# Altium footprint library DBLib.PcbLib: 97 footprints (part 2 of 7)
Each footprint in its own frame and in the unit in brackets; x right, y up, seen from the top. Pads: shape width x height; smd on the part's side, far side on the other; paste and mask are expansions set on the pad; w line width, h text height; cw(c..) or ccw(c..) is an arc to the next point about the centre after c.
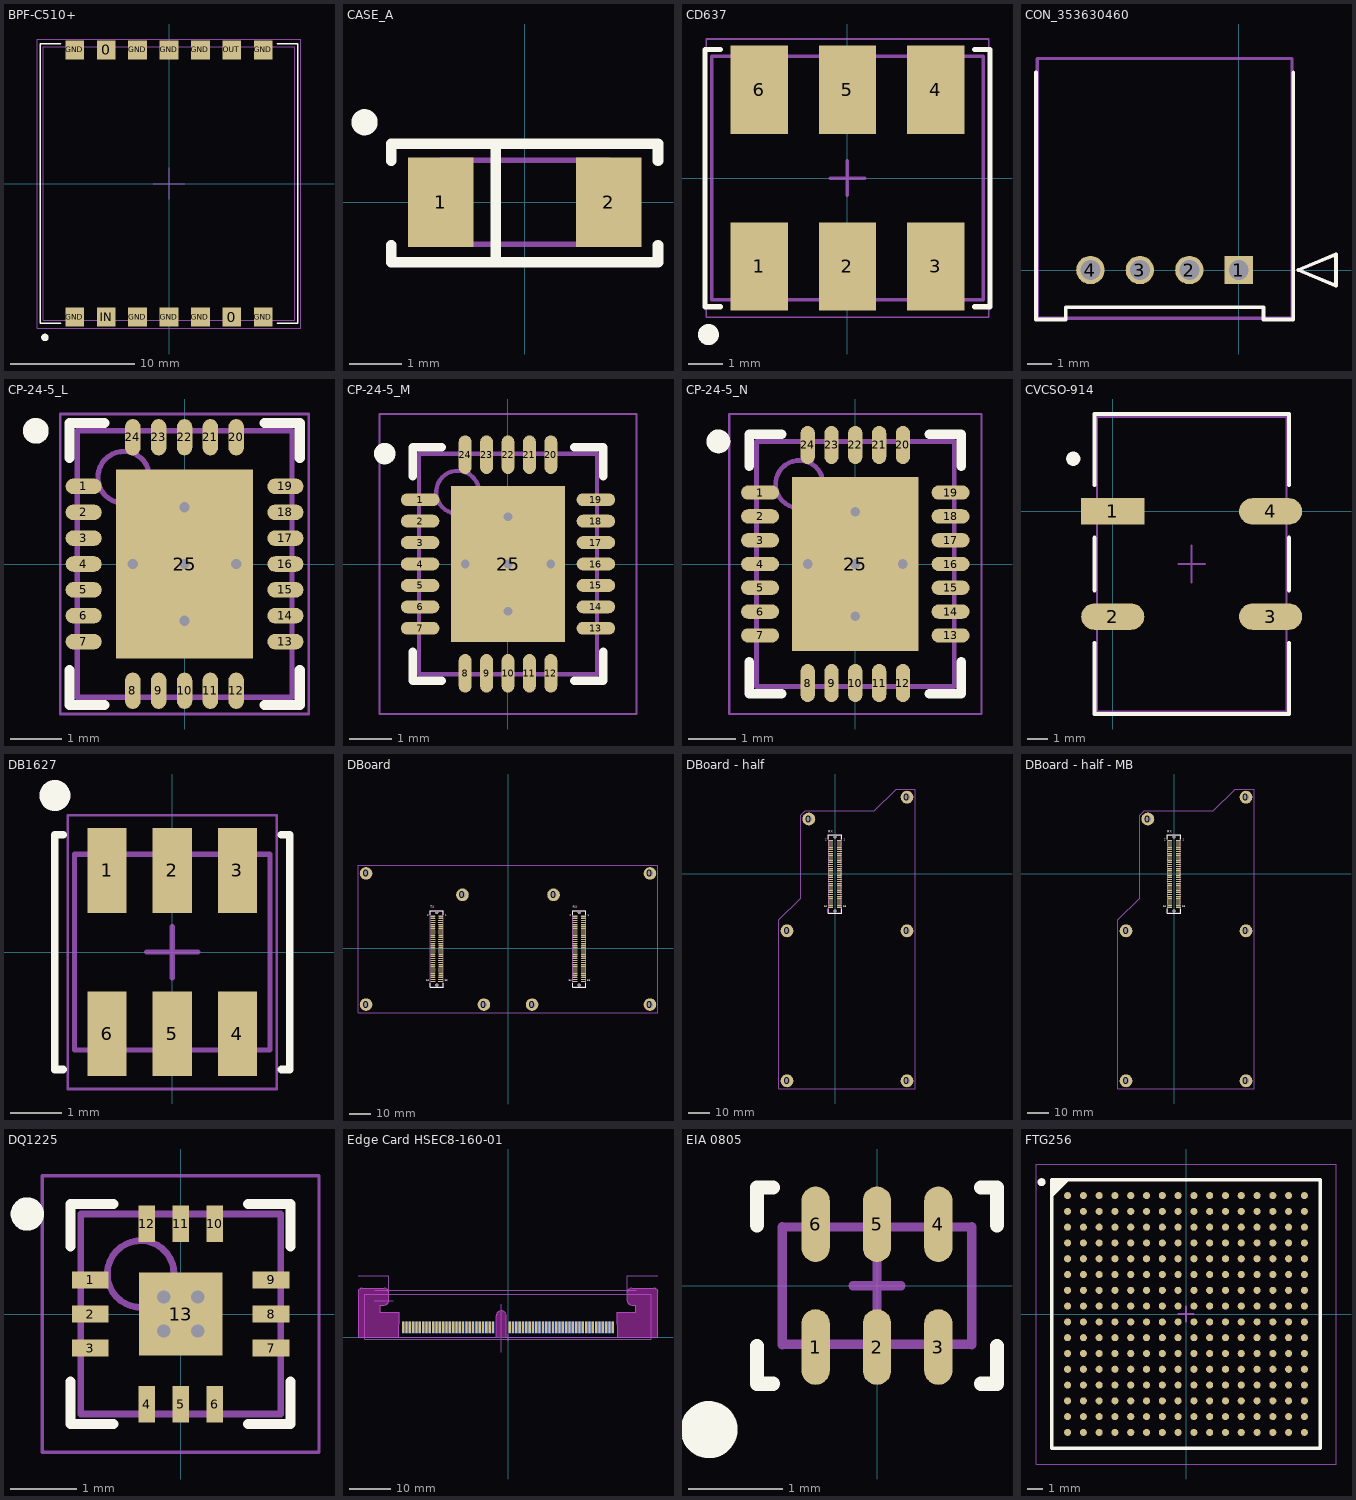
[diagram p1: the footprints below, top view; thin cyan lines are the x and y axes]

## BPF-C510+ [mm] "Bandpass Filter"
height 6.35
pads (14):
  rect 1.52x1.52 smd: 0(-5.08,10.795) 0(5.08,-10.795) GND(-7.62,-10.795) GND(-7.62,10.795) GND(-2.54,-10.795) GND(-2.54,10.795) GND(0,-10.795) GND(0,10.795) GND(2.54,-10.795) GND(2.54,10.795) GND(7.62,-10.795) GND(7.62,10.795) IN(-5.08,-10.795) OUT(5.08,10.795)
Top Overlay:
  circle w0.35: c-10.033,-12.446 r0.127
  lines w0.15: -8.763,-11.303 -10.414,-11.303 -10.414,11.303 -8.763,11.303 ; 8.763,-11.303 10.414,-11.303 10.414,11.303 8.763,11.303
Mechanical 1:
  lines w0.05: -10.668,-11.684 -10.668,11.684 10.668,11.684 10.668,-11.684 -10.668,-11.684
  lines w0.1: -1.27,0 1.27,0 ; 0,-1.27 0,1.27 ; -10.16,-11.049 -10.16,11.049 10.16,11.049 10.16,-11.049 -10.16,-11.049
3D body "User Library-HU1186 pass.step": height 6.35, standoff 0, extent -10.16,-11.07 10.16,11.07

## CASE_A [mm] "Tantalum Cap"
height 0.5
pads (2):
  rect 1.25x1.7 smd: 1(-1.6,0) 2(1.6,0)
Top Overlay:
  circle w0.25: c-3.048,1.524 r0.125
  lines w0.2: -2.54,-0.815 -2.54,-1.143 2.54,-1.143 2.54,-0.815 ; -2.54,0.787 -2.54,1.115 2.54,1.115 2.54,0.787 ; -0.546,-1.143 -0.546,1.115
Mechanical 1:
  lines w0.1: -1.6,-0.8 1.6,-0.8 1.6,0.8 -1.6,0.8 -1.6,-0.8
3D body "User Library-Tantalum Capacitor Case A.STEP": height 1.65, standoff 0, extent -1.698,-0.802 1.693,0.798

## CD637 [mm] "RF Transformer"
height 5.23
pads (6):
  rect 1.65x2.54 smd: 1(-2.54,-2.54) 2(0,-2.54) 3(2.54,-2.54) 4(2.54,2.54) 5(0,2.54) 6(-2.54,2.54)
Top Overlay:
  circle w0.35: c-4,-4.5 r0.127
  lines w0.15: -3.65,-3.7 -4.1,-3.7 -4.1,3.7 -3.65,3.7 ; 3.65,-3.7 4.1,-3.7 4.1,3.7 3.65,3.7
Mechanical 1:
  lines w0.05: -4.064,-4 -4.064,4 4.064,4 4.064,-4 -4.064,-4
  lines w0.1: -0.5,0 0.5,0 ; 0,-0.5 0,0.5 ; -3.9,-3.5 -3.9,3.5 3.9,3.5 3.9,-3.5 -3.9,-3.5
3D body "User Library-CD637.step": height 5.24, standoff 0, extent -3.935,-3.455 3.935,3.455

## CON_353630460 [mm]
pads (4):
  rect 1.15x1.15 hole 0.8 mask+0.076: 1(0,0)
  round 1.15 hole 0.8 mask+0.076: 2(-2,0) 3(-4,0) 4(-6,0)
Top Overlay:
  lines w0.15: -8.2,8 -8.2,-2 -7,-2 -7,-1.5 1,-1.5 1,-2 2.2,-2 2.2,8 ; 2.404,0 3.928,-0.635 3.928,0.635 2.404,0
Mechanical 1:
  lines w0.127: -8.15,-1.95 -8.15,8.55 2.15,8.55 2.15,-1.95 -8.15,-1.95 ; 2.404,0 3.928,-0.635 3.928,0.635 2.404,0
3D body "353630460.stp": height 5.55, standoff -3.15, extent -8.15,-1.95 2.15,8.55
3D body: height 0.25, standoff 0, extent 0,0 0.254,0.254

## CP-24-5_L [mm] "QFN, 24-Leads, Body 4x5mm, Pitch 0.5mm, Thermal Pad 2.65x3.65mm, IPC High Density"
height 1
pads (25):
  oval 0.7x0.3 smd: 1(-1.95,1.5) 2(-1.95,1) 3(-1.95,0.5) 4(-1.95,0) 5(-1.95,-0.5) 6(-1.95,-1) 7(-1.95,-1.5) 13(1.95,-1.5) 14(1.95,-1) 15(1.95,-0.5) 16(1.95,0) 17(1.95,0.5) 18(1.95,1) 19(1.95,1.5)
  oval 0.3x0.7 smd: 8(-1,-2.45) 9(-0.5,-2.45) 10(0,-2.45) 11(0.5,-2.45) 12(1,-2.45) 20(1,2.45) 21(0.5,2.45) 22(0,2.45) 23(-0.5,2.45) 24(-1,2.45)
  rect 2.65x3.65 all layers, no hole paste-1.325 mask+0.102: 25(0,0)
via 0,-1.1 diameter 0.5 hole 0.2
via 1,0 diameter 0.5 hole 0.2
via -1,0 diameter 0.5 hole 0.2
via 0,1.1 diameter 0.5 hole 0.2
via 0,0 diameter 0.5 hole 0.2
Top Overlay:
  circle w0.25: c-2.875,2.575 r0.125
  lines w0.2: -2.225,-2.05 -2.225,-2.725 -1.55,-2.725 ; -2.225,2.05 -2.225,2.725 -1.55,2.725 ; 1.55,-2.725 2.225,-2.725 2.225,-2.05 ; 1.55,2.725 2.225,2.725 2.225,2.05
Top Paste:
  rectangle: 0.15,0.15 1.25,1.75
  region: -0.15,1.75 -1.25,1.75 -1.25,0.15 -0.15,0.15
  region: -0.15,-0.15 -1.25,-0.15 -1.25,-1.75 -0.15,-1.75
  rectangle: 0.15,-1.75 1.25,-0.15
Mechanical 13:
  circle w0.1: c-1.175,1.675 r0.5
  lines w0.1: -2.075,-2.575 2.075,-2.575 2.075,2.575 -2.075,2.575 -2.075,-2.575
Mechanical 15:
  lines w0.05: -2.4,-2.9 2.4,-2.9 2.4,2.9 -2.4,2.9 -2.4,-2.9
  lines w0.1: -0.5,0 0.5,0 ; 0,-0.5 0,0.5
3D body "User Library-AD5760BCPZ.step": height 0.85, standoff -0.05, extent -2.001,-2.501 2.001,2.501

## CP-24-5_M [mm] "QFN, 24-Leads, Body 4x5mm, Pitch 0.5mm, Thermal Pad 2.65x3.65mm, IPC Low Density"
height 1
pads (25):
  oval 0.9x0.3 smd: 1(-2.05,1.5) 2(-2.05,1) 3(-2.05,0.5) 4(-2.05,0) 5(-2.05,-0.5) 6(-2.05,-1) 7(-2.05,-1.5) 13(2.05,-1.5) 14(2.05,-1) 15(2.05,-0.5) 16(2.05,0) 17(2.05,0.5) 18(2.05,1) 19(2.05,1.5)
  oval 0.3x0.9 smd: 8(-1,-2.55) 9(-0.5,-2.55) 10(0,-2.55) 11(0.5,-2.55) 12(1,-2.55) 20(1,2.55) 21(0.5,2.55) 22(0,2.55) 23(-0.5,2.55) 24(-1,2.55)
  rect 2.65x3.65 all layers, no hole paste-1.325 mask+0.102: 25(0,0)
via 0,-1.1 diameter 0.5 hole 0.2
via 1,0 diameter 0.5 hole 0.2
via -1,0 diameter 0.5 hole 0.2
via 0,1.1 diameter 0.5 hole 0.2
via 0,0 diameter 0.5 hole 0.2
Top Overlay:
  circle w0.25: c-2.875,2.575 r0.125
  lines w0.2: -2.225,-2.05 -2.225,-2.725 -1.55,-2.725 ; -2.225,2.05 -2.225,2.725 -1.55,2.725 ; 1.55,-2.725 2.225,-2.725 2.225,-2.05 ; 1.55,2.725 2.225,2.725 2.225,2.05
Top Paste:
  rectangle: 0.15,0.15 1.25,1.75
  region: -0.15,1.75 -1.25,1.75 -1.25,0.15 -0.15,0.15
  region: -0.15,-0.15 -1.25,-0.15 -1.25,-1.75 -0.15,-1.75
  rectangle: 0.15,-1.75 1.25,-0.15
Mechanical 13:
  circle w0.1: c-1.175,1.675 r0.5
  lines w0.1: -2.075,-2.575 -2.075,2.575 2.075,2.575 2.075,-2.575 -2.075,-2.575
Mechanical 15:
  lines w0.05: -3,-3.5 -3,3.5 3,3.5 3,-3.5 -3,-3.5
  lines w0.1: -0.5,0 0.5,0 ; 0,-0.5 0,0.5
3D body "User Library-AD5760BCPZ.step": height 0.85, standoff -0.05, extent -2.001,-2.501 2.001,2.501

## CP-24-5_N [mm] "QFN, 24-Leads, Body 4x5mm, Pitch 0.5mm, Thermal Pad 2.65x3.65mm, IPC Medium Density"
height 1
pads (25):
  oval 0.8x0.3 smd: 1(-2,1.5) 2(-2,1) 3(-2,0.5) 4(-2,0) 5(-2,-0.5) 6(-2,-1) 7(-2,-1.5) 13(2,-1.5) 14(2,-1) 15(2,-0.5) 16(2,0) 17(2,0.5) 18(2,1) 19(2,1.5)
  oval 0.3x0.8 smd: 8(-1,-2.5) 9(-0.5,-2.5) 10(0,-2.5) 11(0.5,-2.5) 12(1,-2.5) 20(1,2.5) 21(0.5,2.5) 22(0,2.5) 23(-0.5,2.5) 24(-1,2.5)
  rect 2.65x3.65 all layers, no hole paste-1.325 mask+0.102: 25(0,0)
via 0,0 diameter 0.5 hole 0.2
via 0,1.1 diameter 0.5 hole 0.2
via -1,0 diameter 0.5 hole 0.2
via 1,0 diameter 0.5 hole 0.2
via 0,-1.1 diameter 0.5 hole 0.2
Top Overlay:
  circle w0.25: c-2.875,2.575 r0.125
  lines w0.2: -2.225,-2.05 -2.225,-2.725 -1.55,-2.725 ; -2.225,2.05 -2.225,2.725 -1.55,2.725 ; 1.55,-2.725 2.225,-2.725 2.225,-2.05 ; 1.55,2.725 2.225,2.725 2.225,2.05
Top Paste:
  rectangle: 0.15,-1.75 1.25,-0.15
  region: -0.15,-0.15 -1.25,-0.15 -1.25,-1.75 -0.15,-1.75
  region: -0.15,1.75 -1.25,1.75 -1.25,0.15 -0.15,0.15
  rectangle: 0.15,0.15 1.25,1.75
Mechanical 13:
  circle w0.1: c-1.175,1.675 r0.5
  lines w0.1: -2.075,-2.575 -2.075,2.575 2.075,2.575 2.075,-2.575 -2.075,-2.575
Mechanical 15:
  lines w0.05: -2.65,-3.15 -2.65,3.15 2.65,3.15 2.65,-3.15 -2.65,-3.15
  lines w0.1: -0.5,0 0.5,0 ; 0,-0.5 0,0.5
3D body "User Library-AD5760BCPZ.step": height 0.85, standoff -0.05, extent -2.001,-2.501 2.001,2.501

## CVCSO-914 [mil] "9?14 mm SMD"
height 210
pads (4):
  rect 120x50 smd: 1(0,0)
  oval 120x50 smd: 2(0,-200) 3(300,-200) 4(300,0)
Top Overlay:
  circle w13.78: c-75,100 r6.63
  lines w7.87: -35,-250 -35,-385 335,-385 335,-250 ; -35,-150 -35,-50 ; -35,50 -35,185 335,185 335,50 ; 335,-150 335,-50
Mechanical 1:
  lines w3.94: 125,-100 175,-100 ; 150,-135 150,-65 ; -30.31,-380 -30.31,179.05 330.31,179.05 330.31,-380 -30.31,-380
3D body "User Library-CVHD-950.step": height 208.66, standoff 0, extent -30.31,-380 330.31,179.05

## DB1627 [mm] "RF Transformer"
height 4.06
pads (6):
  rect 0.76x1.65 smd: 1(-1.27,1.59) 2(0,1.59) 3(1.27,1.59) 4(1.27,-1.59) 5(0,-1.59) 6(-1.27,-1.59)
Top Overlay:
  circle w0.35: c-2.286,3.048 r0.127
  lines w0.15: -2.126,-2.286 -2.286,-2.286 -2.286,2.286 -2.126,2.286 ; 2.126,-2.286 2.286,-2.286 2.286,2.286 2.126,2.286
Mechanical 1:
  lines w0.05: -2.032,-2.667 2.032,-2.667 2.032,2.667 -2.032,2.667 -2.032,-2.667
  lines w0.1: -0.5,0 0.5,0 ; 0,-0.5 0,0.5 ; -1.905,-1.905 1.905,-1.905 1.905,1.905 -1.905,1.905 -1.905,-1.905
3D body "User Library-RF Transformer SMD.step": height 2.79, standoff -0.02, extent -1.905,-1.923 1.905,1.923

## DBoard [mm] "USRP DBoard"
height 10
pads (140):
  round 6 hole 3: 0(-67.31,-26.67) 0(-67.31,35.56) 0(-21.59,25.4) 0(-11.43,-26.67) 0(11.43,-26.67) 0(21.59,25.4) 0(67.31,-26.67) 0(67.31,35.56)
  round 1.5 hole 1.5 unplated: 0(-33.782,-17.446) 0(-33.782,16.954) 0(33.782,-17.446) 0(33.782,16.954)
  oval 2.3x0.6 smd: 1(-31.932,15.254) 2(-35.632,15.254) 3(-31.932,14.254) 4(-35.632,14.254) 5(-31.932,13.254) 6(-35.632,13.254) 7(-31.932,12.254) 8(-35.632,12.254) 9(-31.932,11.254) 10(-35.632,11.254) 11(-31.932,10.254) 12(-35.632,10.254) 13(-31.932,9.254) 14(-35.632,9.254) 15(-31.932,8.254) 16(-35.632,8.254) 17(-31.932,7.254) 18(-35.632,7.254) 19(-31.932,6.254) 20(-35.632,6.254) 21(-31.932,5.254) 22(-35.632,5.254) 23(-31.932,4.254) 24(-35.632,4.254) 25(-31.932,3.254) 26(-35.632,3.254) 27(-31.932,2.254) 28(-35.632,2.254) 29(-31.932,1.254) 30(-35.632,1.254) 31(-31.932,0.254) 32(-35.632,0.254) 33(-31.932,-0.746) 34(-35.632,-0.746) 35(-31.932,-1.746) 36(-35.632,-1.746) 37(-31.932,-2.746) 38(-35.632,-2.746) 39(-31.932,-3.746) 40(-35.632,-3.746) 41(-31.932,-4.746) 42(-35.632,-4.746) 43(-31.932,-5.746) 44(-35.632,-5.746) 45(-31.932,-6.746) 46(-35.632,-6.746) 47(-31.932,-7.746) 48(-35.632,-7.746) 49(-31.932,-8.746) 50(-35.632,-8.746) 51(-31.932,-9.746) 52(-35.632,-9.746) 53(-31.932,-10.746) 54(-35.632,-10.746) 55(-31.932,-11.746) 56(-35.632,-11.746) 57(-31.932,-12.746) 58(-35.632,-12.746) 59(-31.932,-13.746) 60(-35.632,-13.746) 61(-31.932,-14.746) 62(-35.632,-14.746) 63(-31.932,-15.746) 64(-35.632,-15.746)
  oval 2.337x0.61 smd: 65(35.782,15.254) 66(31.782,15.254) 67(35.782,14.254) 68(31.782,14.254) 69(35.782,13.254) 70(31.782,13.254) 71(35.782,12.254) 72(31.782,12.254) 73(35.782,11.254) 74(31.782,11.254) 75(35.782,10.254) 76(31.782,10.254) 77(35.782,9.254) 78(31.782,9.254) 79(35.782,8.254) 80(31.782,8.254) 81(35.782,7.254) 82(31.782,7.254) 83(35.782,6.254) 84(31.782,6.254) 85(35.782,5.254) 86(31.782,5.254) 87(35.782,4.254) 88(31.782,4.254) 89(35.782,3.254) 90(31.782,3.254) 91(35.782,2.254) 92(31.782,2.254) 93(35.782,1.254) 94(31.782,1.254) 95(35.782,0.254) 96(31.782,0.254) 97(35.782,-0.746) 98(31.782,-0.746) 99(35.782,-1.746) 100(31.782,-1.746) 101(35.782,-2.746) 102(31.782,-2.746) 103(35.782,-3.746) 104(31.782,-3.746) 105(35.782,-4.746) 106(31.782,-4.746) 107(35.782,-5.746) 108(31.782,-5.746) 109(35.782,-6.746) 110(31.782,-6.746) 111(35.782,-7.746) 112(31.782,-7.746) 113(35.782,-8.746) 114(31.782,-8.746) 115(35.782,-9.746) 116(31.782,-9.746) 117(35.782,-10.746) 118(31.782,-10.746) 119(35.782,-11.746) 120(31.782,-11.746) 121(35.782,-12.746) 122(31.782,-12.746) 123(35.782,-13.746) 124(31.782,-13.746) 125(35.782,-14.746) 126(31.782,-14.746) 127(35.782,-15.746) 128(31.782,-15.746)
Top Overlay:
  lines w0.2: -36.982,-16.446 -36.982,-18.446 -30.582,-18.446 -30.582,-16.446 ; -36.982,15.954 -36.982,17.954 -30.582,17.954 -30.582,15.954 ; 30.582,-16.446 30.582,-18.446 36.982,-18.446 36.982,-16.446 ; 30.582,15.954 30.582,17.954 36.982,17.954 36.982,15.954
  text "64" at -38.782,-16.146 h1.27
  text "63" at -29.882,-16.146 h1.27
  text "1" at -29.682,14.854 h1.27
  text "2" at -38.282,14.854 h1.27
  text "TX" at -36.812,18.596 h2
  text "RX" at 30.752,18.596 h2
  text "2" at 29.282,14.854 h1.27
  text "1" at 37.882,14.854 h1.27
  text "63" at 37.682,-16.146 h1.27
  text "64" at 28.782,-16.146 h1.27
Mechanical 1:
  lines w0.1: -36.782,-18.246 -36.782,17.754 -30.782,17.754 -30.782,-18.246 -36.782,-18.246 ; 30.782,-18.246 36.782,-18.246 36.782,17.754 30.782,17.754 30.782,-18.246
  lines w0.254: -71.12,-30.48 71.12,-30.48 71.12,39.37 -71.12,39.37 -71.12,-30.48
3D body "714390164.stp": height 5.31, standoff -0.79, extent -36.832,-18.196 -30.732,17.704
3D body "714390164.stp": height 5.31, standoff -0.79, extent 30.732,-18.196 36.832,17.704

## DBoard - half [mil] "USRP DBoard"
height 393.7
pads (72):
  round 236.22 hole 118.11: 0(-880,-3800) 0(-880,-1050) 0(-480,1000) 0(1320,-3800) 0(1320,-1050) 0(1320,1400)
  round 59.06 hole 59.06 unplated: 0(0,-686.85) 0(0,667.48)
  oval 92x24 smd: 65(78.74,600.55) 66(-78.74,600.55) 67(78.74,561.18) 68(-78.74,561.18) 69(78.74,521.81) 70(-78.74,521.81) 71(78.74,482.44) 72(-78.74,482.44) 73(78.74,443.07) 74(-78.74,443.07) 75(78.74,403.7) 76(-78.74,403.7) 77(78.74,364.33) 78(-78.74,364.33) 79(78.74,324.96) 80(-78.74,324.96) 81(78.74,285.59) 82(-78.74,285.59) 83(78.74,246.22) 84(-78.74,246.22) 85(78.74,206.85) 86(-78.74,206.85) 87(78.74,167.48) 88(-78.74,167.48) 89(78.74,128.11) 90(-78.74,128.11) 91(78.74,88.74) 92(-78.74,88.74) 93(78.74,49.37) 94(-78.74,49.37) 95(78.74,10) 96(-78.74,10) 97(78.74,-29.37) 98(-78.74,-29.37) 99(78.74,-68.74) 100(-78.74,-68.74) 101(78.74,-108.11) 102(-78.74,-108.11) 103(78.74,-147.48) 104(-78.74,-147.48) 105(78.74,-186.85) 106(-78.74,-186.85) 107(78.74,-226.22) 108(-78.74,-226.22) 109(78.74,-265.59) 110(-78.74,-265.59) 111(78.74,-304.96) 112(-78.74,-304.96) 113(78.74,-344.33) 114(-78.74,-344.33) 115(78.74,-383.7) 116(-78.74,-383.7) 117(78.74,-423.07) 118(-78.74,-423.07) 119(78.74,-462.44) 120(-78.74,-462.44) 121(78.74,-501.81) 122(-78.74,-501.81) 123(78.74,-541.18) 124(-78.74,-541.18) 125(78.74,-580.55) 126(-78.74,-580.55) 127(78.74,-619.92) 128(-78.74,-619.92)
Top Overlay:
  lines w7.87: -125.98,-647.48 -125.98,-726.22 125.98,-726.22 125.98,-647.48 ; -125.98,628.11 -125.98,706.85 125.98,706.85 125.98,628.11
  text "64" at -196.85,-635.67 h50
  text "2" at -177.17,584.8 h50
  text "RX" at -119.29,732.13 h78.74
  text "1" at 161.42,584.8 h50
  text "63" at 153.54,-635.67 h50
Mechanical 1:
  lines w3.94: -118.11,-718.35 118.11,-718.35 118.11,698.98 -118.11,698.98 -118.11,-718.35
  lines w10: -1030,-3950 -1030,-850 -630,-450 -630,1070 -550,1150 720,1150 1120,1550 1470,1550 1470,-3950 -1030,-3950
3D body "714390164.stp": height 209.02, standoff -31, extent -120.08,-716.38 120.08,697.01

## DBoard - half - MB [mil] "USRP DBoard"
height 393.7
pads (72):
  round 236.22 hole 118.11: 0(-880,-3800) 0(-880,-1050) 0(-480,1000) 0(1320,-3800) 0(1320,-1050) 0(1320,1400)
  round 59.06 hole 59.06 unplated: 0(0,-686.85) 0(0,667.48)
  oval 92x24 smd: 65(78.74,600.55) 66(-78.74,600.55) 67(78.74,561.18) 68(-78.74,561.18) 69(78.74,521.81) 70(-78.74,521.81) 71(78.74,482.44) 72(-78.74,482.44) 73(78.74,443.07) 74(-78.74,443.07) 75(78.74,403.7) 76(-78.74,403.7) 77(78.74,364.33) 78(-78.74,364.33) 79(78.74,324.96) 80(-78.74,324.96) 81(78.74,285.59) 82(-78.74,285.59) 83(78.74,246.22) 84(-78.74,246.22) 85(78.74,206.85) 86(-78.74,206.85) 87(78.74,167.48) 88(-78.74,167.48) 89(78.74,128.11) 90(-78.74,128.11) 91(78.74,88.74) 92(-78.74,88.74) 93(78.74,49.37) 94(-78.74,49.37) 95(78.74,10) 96(-78.74,10) 97(78.74,-29.37) 98(-78.74,-29.37) 99(78.74,-68.74) 100(-78.74,-68.74) 101(78.74,-108.11) 102(-78.74,-108.11) 103(78.74,-147.48) 104(-78.74,-147.48) 105(78.74,-186.85) 106(-78.74,-186.85) 107(78.74,-226.22) 108(-78.74,-226.22) 109(78.74,-265.59) 110(-78.74,-265.59) 111(78.74,-304.96) 112(-78.74,-304.96) 113(78.74,-344.33) 114(-78.74,-344.33) 115(78.74,-383.7) 116(-78.74,-383.7) 117(78.74,-423.07) 118(-78.74,-423.07) 119(78.74,-462.44) 120(-78.74,-462.44) 121(78.74,-501.81) 122(-78.74,-501.81) 123(78.74,-541.18) 124(-78.74,-541.18) 125(78.74,-580.55) 126(-78.74,-580.55) 127(78.74,-619.92) 128(-78.74,-619.92)
Top Overlay:
  lines w7.87: -125.98,-647.48 -125.98,-726.22 125.98,-726.22 125.98,-647.48 ; -125.98,628.11 -125.98,706.85 125.98,706.85 125.98,628.11
  text "64" at -196.85,-635.67 h50
  text "2" at -177.17,584.8 h50
  text "RX" at -119.29,732.13 h78.74
  text "1" at 161.42,584.8 h50
  text "63" at 153.54,-635.67 h50
Mechanical 1:
  lines w3.94: -118.11,-718.35 118.11,-718.35 118.11,698.98 -118.11,698.98 -118.11,-718.35
  lines w10: -1030,-3950 -1030,-850 -630,-450 -630,1070 -550,1150 720,1150 1120,1550 1470,1550 1470,-3950 -1030,-3950
3D body "714390164.stp": height 209.02, standoff -31, extent -120.08,-716.38 120.08,697.01
3D body "MotherBoard.STEP": height 534.2, standoff -238.65, extent -5280.5,-1203.54 1496.16,3520.87

## DQ1225 [mm] "QFN, 12-Leads, Body 3,00x3,00mm, Pitch 0,51mm, Thermal Pad 1,45x1,45mm, IPC Medium Density"
height 0.9
pads (13):
  rect 0.55x0.25 smd: 1(-1.355,0.51) 2(-1.355,0) 3(-1.355,-0.51) 7(1.355,-0.51) 8(1.355,0) 9(1.355,0.51)
  rect 0.25x0.55 smd: 4(-0.51,-1.355) 5(0,-1.355) 6(0.51,-1.355) 10(0.51,1.355) 11(0,1.355) 12(-0.51,1.355)
  rect 1.25x1.25 all layers, no hole mask+0.102: 13(0,0)
via -0.254,0.254 diameter 0.4 hole 0.2
via 0.254,0.254 diameter 0.4 hole 0.2
via 0.254,-0.254 diameter 0.4 hole 0.2
via -0.254,-0.254 diameter 0.4 hole 0.2
Top Overlay:
  circle w0.25: c-2.3,1.5 r0.125
  lines w0.15: -1.65,-1.01 -1.65,-1.65 -1.01,-1.65 ; -1.65,1.01 -1.65,1.65 -1.01,1.65 ; 1.01,-1.65 1.65,-1.65 1.65,-1.01 ; 1.01,1.65 1.65,1.65 1.65,1.01
Mechanical 1:
  circle w0.1: c-0.6,0.6 r0.5
  lines w0.05: -2.075,-2.075 2.075,-2.075 2.075,2.075 -2.075,2.075 -2.075,-2.075
  lines w0.1: -0.5,0 0.5,0 ; 0,-0.5 0,0.5 ; -1.5,-1.5 1.5,-1.5 1.5,1.5 -1.5,1.5 -1.5,-1.5
3D body "User Library-QFN12_3x3x0_8.step": height 0.78, standoff -0.02, extent -1.51,-1.51 1.51,1.51

## Edge Card HSEC8-160-01 [mm] "0.80 mm High-Speed Edge Card"
pads (120):
  rect 0.55x2.8 smd far side: 1(25.2,2.4) 3(24.4,2.4) 5(23.6,2.4) 7(22.8,2.4) 9(22,2.4) 11(21.2,2.4) 13(20.4,2.4) 15(19.6,2.4) 17(18.8,2.4) 19(18,2.4) 21(17.2,2.4) 23(16.4,2.4) 25(15.6,2.4) 27(14.8,2.4) 29(14,2.4) 31(13.2,2.4) 33(12.4,2.4) 35(11.6,2.4) 37(10.8,2.4) 39(10,2.4) 41(9.2,2.4) 43(8.4,2.4) 45(7.6,2.4) 47(6.8,2.4) 49(6,2.4) 51(5.2,2.4) 53(4.4,2.4) 55(3.6,2.4) 57(2.8,2.4) 59(2,2.4) 61(1.2,2.4) 63(0.4,2.4) 65(-3.6,2.4) 67(-4.4,2.4) 69(-5.2,2.4) 71(-6,2.4) 73(-6.8,2.4) 75(-7.6,2.4) 77(-8.4,2.4) 79(-9.2,2.4) 81(-10,2.4) 83(-10.8,2.4) 85(-11.6,2.4) 87(-12.4,2.4) 89(-13.2,2.4) 91(-14,2.4) 93(-14.8,2.4) 95(-15.6,2.4) 97(-16.4,2.4) 99(-17.2,2.4) 101(-18,2.4) 103(-18.8,2.4) 105(-19.6,2.4) 107(-20.4,2.4) 109(-21.2,2.4) 111(-22,2.4) 113(-22.8,2.4) 115(-23.6,2.4) 117(-24.4,2.4) 119(-25.2,2.4)
  rect 0.55x2.8 smd: 2(25.2,2.4) 4(24.4,2.4) 6(23.6,2.4) 8(22.8,2.4) 10(22,2.4) 12(21.2,2.4) 14(20.4,2.4) 16(19.6,2.4) 18(18.8,2.4) 20(18,2.4) 22(17.2,2.4) 24(16.4,2.4) 26(15.6,2.4) 28(14.8,2.4) 30(14,2.4) 32(13.2,2.4) 34(12.4,2.4) 36(11.6,2.4) 38(10.8,2.4) 40(10,2.4) 42(9.2,2.4) 44(8.4,2.4) 46(7.6,2.4) 48(6.8,2.4) 50(6,2.4) 52(5.2,2.4) 54(4.4,2.4) 56(3.6,2.4) 58(2.8,2.4) 60(2,2.4) 62(1.2,2.4) 64(0.4,2.4) 66(-3.6,2.4) 68(-4.4,2.4) 70(-5.2,2.4) 72(-6,2.4) 74(-6.8,2.4) 76(-7.6,2.4) 78(-8.4,2.4) 80(-9.2,2.4) 82(-10,2.4) 84(-10.8,2.4) 86(-11.6,2.4) 88(-12.4,2.4) 90(-13.2,2.4) 92(-14,2.4) 94(-14.8,2.4) 96(-15.6,2.4) 98(-16.4,2.4) 100(-17.2,2.4) 102(-18,2.4) 104(-18.8,2.4) 106(-19.6,2.4) 108(-20.4,2.4) 110(-21.2,2.4) 112(-22,2.4) 114(-22.8,2.4) 116(-23.6,2.4) 118(-24.4,2.4) 120(-25.2,2.4)
Keep-Out Layer:
  board cut-out: -2.8,0 -0.4,0 -0.4,5.2 -0.4,5.358 -0.482,5.663 -0.64,5.937 -0.863,6.16 -1.137,6.318 -1.442,6.4 -1.758,6.4 -2.063,6.318 -2.337,6.16 -2.56,5.937 -2.718,5.663 -2.8,5.358 -2.8,5.2
  board cut-out: 36.075,0 36.075,10.82 36.075,10.918 36.037,11.112 35.961,11.294 35.852,11.457 35.712,11.597 35.549,11.706 35.367,11.782 35.173,11.82 35.075,11.82 29.725,11.82 29.627,11.82 29.433,11.782 29.251,11.706 29.088,11.597 28.948,11.457 28.839,11.294 28.763,11.112 28.725,10.918 28.725,10.82 28.725,8.78 28.725,8.682 28.763,8.488 28.839,8.306 28.948,8.143 29.088,8.003 29.251,7.894 29.433,7.818 29.627,7.78 29.725,7.78 30.725,7.78 30.725,6 26.2,6 26.226,0
  board cut-out: -36.075,0 -36.075,10.82 -36.075,10.918 -36.037,11.112 -35.961,11.294 -35.852,11.457 -35.712,11.597 -35.549,11.706 -35.367,11.782 -35.173,11.82 -35.075,11.82 -29.725,11.82 -29.627,11.82 -29.433,11.782 -29.251,11.706 -29.088,11.597 -28.948,11.457 -28.839,11.294 -28.763,11.112 -28.725,10.918 -28.725,10.82 -28.725,8.78 -28.725,8.682 -28.763,8.488 -28.839,8.306 -28.948,8.143 -29.088,8.003 -29.251,7.894 -29.433,7.818 -29.627,7.78 -29.725,7.78 -30.725,7.78 -30.725,6 -26.2,6 -26.226,0
Mechanical 1:
  lines w0.15: -34.4,-0.4 34.4,-0.4 34.4,10.4 -34.4,10.4 -34.4,-0.4
  lines w0.2: -0.8,0 0.8,0 ; 0,-0.8 0,0.8
Mechanical 15:
  lines w0.1: -36.075,0 -36.075,10.82 cw(c-35.075,10.82) -35.075,11.82 -29.725,11.82 cw(c-29.725,10.82) -28.725,10.82 -28.725,8.78 cw(c-29.725,8.78) -29.725,7.78 -30.725,7.78 -30.725,6 -26.2,6 -26.226,0 -36.075,0 ; 26.2,6 26.226,0 36.075,0 36.075,10.82 ccw(c35.075,10.82) 35.075,11.82 29.725,11.82 ccw(c29.725,10.82) 28.725,10.82 28.725,8.78 ccw(c29.725,8.78) 29.725,7.78 30.725,7.78 30.725,6 26.2,6
Boarder:
  lines w0.1: -36,14.84 -28.725,14.84 -28.725,8.78 cw(c-29.725,8.78) -29.725,7.78 -30.725,7.78 -30.725,6 -26.2,6 -26.226,0 -2.8,0 -2.8,5.2 cw(c-1.6,5.2) -0.4,5.2 -0.4,0 26.225,0 26.2,6 30.725,6 30.725,7.78 ; 36,14.84 28.725,14.84 28.725,8.78 ccw(c29.725,8.78) 29.725,7.78 30.725,7.78 ; 30.725,7.78 30.725,7.78
Supp Geometry:
  lines w0.1: -32,8.78 -27.6,8.78 ; -32,11.38 30.8,11.38 ; -1.6,-3.6 -1.6,8
3D body "HSEC8-160-01-S-RA-BL.stp": height 2.36, standoff -5.04, extent -33.65,-5.85 33.65,9.8

## EIA 0805 [mm] "Multilayer Balun"
height 0.95
pads (6):
  oval 0.3x0.8 smd: 1(-0.65,-0.65) 2(0,-0.65) 3(0.65,-0.65) 4(0.65,0.65) 5(0,0.65) 6(-0.65,0.65)
Top Overlay:
  circle w0.35: c-1.778,-1.524 r0.127
  lines w0.15: -1.27,-0.638 -1.27,-1.038 -1.101,-1.038 ; -1.27,0.638 -1.27,1.038 -1.101,1.038 ; 1.101,-1.038 1.27,-1.038 1.27,-0.638 ; 1.101,1.038 1.27,1.038 1.27,0.638
Mechanical 1:
  lines w0.1: -1.005,-0.625 -1.005,0.625 ; -1.005,-0.62 1,-0.62 ; -1.005,0.62 1,0.62 ; -0.254,0 0.254,0 ; 0,-0.254 0,0.254 ; 1.005,-0.625 1.005,0.625
3D body "User Library-Balun2450FB15L0001.step": height 0.8, standoff 0, extent -1,-0.625 1,0.625

## FTG256 [mm] "BGA, 256-Leads, Body 17x17mm, Pitch 1mm"
height 1.55
pads (256):
  round 0.45 smd: A1(-7.5,7.5) A2(-6.5,7.5) A3(-5.5,7.5) A4(-4.5,7.5) A5(-3.5,7.5) A6(-2.5,7.5) A7(-1.5,7.5) A8(-0.5,7.5) A9(0.5,7.5) A10(1.5,7.5) A11(2.5,7.5) A12(3.5,7.5) A13(4.5,7.5) A14(5.5,7.5) A15(6.5,7.5) A16(7.5,7.5) B1(-7.5,6.5) B2(-6.5,6.5) B3(-5.5,6.5) B4(-4.5,6.5) B5(-3.5,6.5) B6(-2.5,6.5) B7(-1.5,6.5) B8(-0.5,6.5) B9(0.5,6.5) B10(1.5,6.5) B11(2.5,6.5) B12(3.5,6.5) B13(4.5,6.5) B14(5.5,6.5) B15(6.5,6.5) B16(7.5,6.5) C1(-7.5,5.5) C2(-6.5,5.5) C3(-5.5,5.5) C4(-4.5,5.5) C5(-3.5,5.5) C6(-2.5,5.5) C7(-1.5,5.5) C8(-0.5,5.5) C9(0.5,5.5) C10(1.5,5.5) C11(2.5,5.5) C12(3.5,5.5) C13(4.5,5.5) C14(5.5,5.5) C15(6.5,5.5) C16(7.5,5.5) D1(-7.5,4.5) D2(-6.5,4.5) D3(-5.5,4.5) D4(-4.5,4.5) D5(-3.5,4.5) D6(-2.5,4.5) D7(-1.5,4.5) D8(-0.5,4.5) D9(0.5,4.5) D10(1.5,4.5) D11(2.5,4.5) D12(3.5,4.5) D13(4.5,4.5) D14(5.5,4.5) D15(6.5,4.5) D16(7.5,4.5) E1(-7.5,3.5) E2(-6.5,3.5) E3(-5.5,3.5) E4(-4.5,3.5) E5(-3.5,3.5) E6(-2.5,3.5) E7(-1.5,3.5) E8(-0.5,3.5) E9(0.5,3.5) E10(1.5,3.5) E11(2.5,3.5) E12(3.5,3.5) E13(4.5,3.5) E14(5.5,3.5) E15(6.5,3.5) E16(7.5,3.5) F1(-7.5,2.5) F2(-6.5,2.5) F3(-5.5,2.5) F4(-4.5,2.5) F5(-3.5,2.5) F6(-2.5,2.5) F7(-1.5,2.5) F8(-0.5,2.5) F9(0.5,2.5) F10(1.5,2.5) F11(2.5,2.5) F12(3.5,2.5) F13(4.5,2.5) F14(5.5,2.5) F15(6.5,2.5) F16(7.5,2.5) G1(-7.5,1.5) G2(-6.5,1.5) G3(-5.5,1.5) G4(-4.5,1.5) G5(-3.5,1.5) G6(-2.5,1.5) G7(-1.5,1.5) G8(-0.5,1.5) G9(0.5,1.5) G10(1.5,1.5) G11(2.5,1.5) G12(3.5,1.5) G13(4.5,1.5) G14(5.5,1.5) G15(6.5,1.5) G16(7.5,1.5) H1(-7.5,0.5) H2(-6.5,0.5) H3(-5.5,0.5) H4(-4.5,0.5) H5(-3.5,0.5) H6(-2.5,0.5) H7(-1.5,0.5) H8(-0.5,0.5) H9(0.5,0.5) H10(1.5,0.5) H11(2.5,0.5) H12(3.5,0.5) H13(4.5,0.5) H14(5.5,0.5) H15(6.5,0.5) H16(7.5,0.5) J1(-7.5,-0.5) J2(-6.5,-0.5) J3(-5.5,-0.5) J4(-4.5,-0.5) J5(-3.5,-0.5) J6(-2.5,-0.5) J7(-1.5,-0.5) J8(-0.5,-0.5) J9(0.5,-0.5) J10(1.5,-0.5) J11(2.5,-0.5) J12(3.5,-0.5) J13(4.5,-0.5) J14(5.5,-0.5) J15(6.5,-0.5) J16(7.5,-0.5) K1(-7.5,-1.5) K2(-6.5,-1.5) K3(-5.5,-1.5) K4(-4.5,-1.5) K5(-3.5,-1.5) K6(-2.5,-1.5) K7(-1.5,-1.5) K8(-0.5,-1.5) K9(0.5,-1.5) K10(1.5,-1.5) K11(2.5,-1.5) K12(3.5,-1.5) K13(4.5,-1.5) K14(5.5,-1.5) K15(6.5,-1.5) K16(7.5,-1.5) L1(-7.5,-2.5) L2(-6.5,-2.5) L3(-5.5,-2.5) L4(-4.5,-2.5) L5(-3.5,-2.5) L6(-2.5,-2.5) L7(-1.5,-2.5) L8(-0.5,-2.5) L9(0.5,-2.5) L10(1.5,-2.5) L11(2.5,-2.5) L12(3.5,-2.5) L13(4.5,-2.5) L14(5.5,-2.5) L15(6.5,-2.5) L16(7.5,-2.5) M1(-7.5,-3.5) M2(-6.5,-3.5) M3(-5.5,-3.5) M4(-4.5,-3.5) M5(-3.5,-3.5) M6(-2.5,-3.5) M7(-1.5,-3.5) M8(-0.5,-3.5) M9(0.5,-3.5) M10(1.5,-3.5) M11(2.5,-3.5) M12(3.5,-3.5) M13(4.5,-3.5) M14(5.5,-3.5) M15(6.5,-3.5) M16(7.5,-3.5) N1(-7.5,-4.5) N2(-6.5,-4.5) N3(-5.5,-4.5) N4(-4.5,-4.5) N5(-3.5,-4.5) N6(-2.5,-4.5) N7(-1.5,-4.5) N8(-0.5,-4.5) N9(0.5,-4.5) N10(1.5,-4.5) N11(2.5,-4.5) N12(3.5,-4.5) N13(4.5,-4.5) N14(5.5,-4.5) N15(6.5,-4.5) N16(7.5,-4.5) P1(-7.5,-5.5) P2(-6.5,-5.5) P3(-5.5,-5.5) P4(-4.5,-5.5) P5(-3.5,-5.5) P6(-2.5,-5.5) P7(-1.5,-5.5) P8(-0.5,-5.5) P9(0.5,-5.5) P10(1.5,-5.5) P11(2.5,-5.5) P12(3.5,-5.5) P13(4.5,-5.5) P14(5.5,-5.5) P15(6.5,-5.5) P16(7.5,-5.5) R1(-7.5,-6.5) R2(-6.5,-6.5) R3(-5.5,-6.5) R4(-4.5,-6.5) R5(-3.5,-6.5) R6(-2.5,-6.5) R7(-1.5,-6.5) R8(-0.5,-6.5) R9(0.5,-6.5) R10(1.5,-6.5) R11(2.5,-6.5) R12(3.5,-6.5) R13(4.5,-6.5) R14(5.5,-6.5) R15(6.5,-6.5) R16(7.5,-6.5) T1(-7.5,-7.5) T2(-6.5,-7.5) T3(-5.5,-7.5) T4(-4.5,-7.5) T5(-3.5,-7.5) T6(-2.5,-7.5) T7(-1.5,-7.5) T8(-0.5,-7.5) T9(0.5,-7.5) T10(1.5,-7.5) T11(2.5,-7.5) T12(3.5,-7.5) T13(4.5,-7.5) T14(5.5,-7.5) T15(6.5,-7.5) T16(7.5,-7.5)
Top Overlay:
  circle w0.25: c-9.15,8.35 r0.125
  region: -7.5,8.5 -8.5,7.5 -8.5,8.5
  lines w0.2: -8.5,7.5 -7.5,8.5 ; -8.5,-8.5 -8.5,8.5 8.5,8.5 8.5,-8.5 -8.5,-8.5
Mechanical 13:
  lines w0.1: -8.5,-8.5 -8.5,8.5 8.5,8.5 8.5,-8.5 -8.5,-8.5
Mechanical 15:
  lines w0.05: -9.5,-9.5 -9.5,9.5 9.5,9.5 9.5,-9.5 -9.5,-9.5
  lines w0.1: -0.5,0 0.5,0 ; 0,-0.5 0,0.5
3D body "User Library-BGA 256 17x17mm 1mm pitch.step": height 1.7, standoff -0.05, extent -8.5,-8.5 8.5,8.5